# Altium footprint library 6-Connectors-4.PcbLib: 166 footprints (part 7 of 12)
Each footprint in its own frame and in the unit in brackets; x right, y up, seen from the top. Pads: shape width x height; smd on the part's side, far side on the other; paste and mask are expansions set on the pad; w line width, h text height; cw(c..) or ccw(c..) is an arc to the next point about the centre after c.
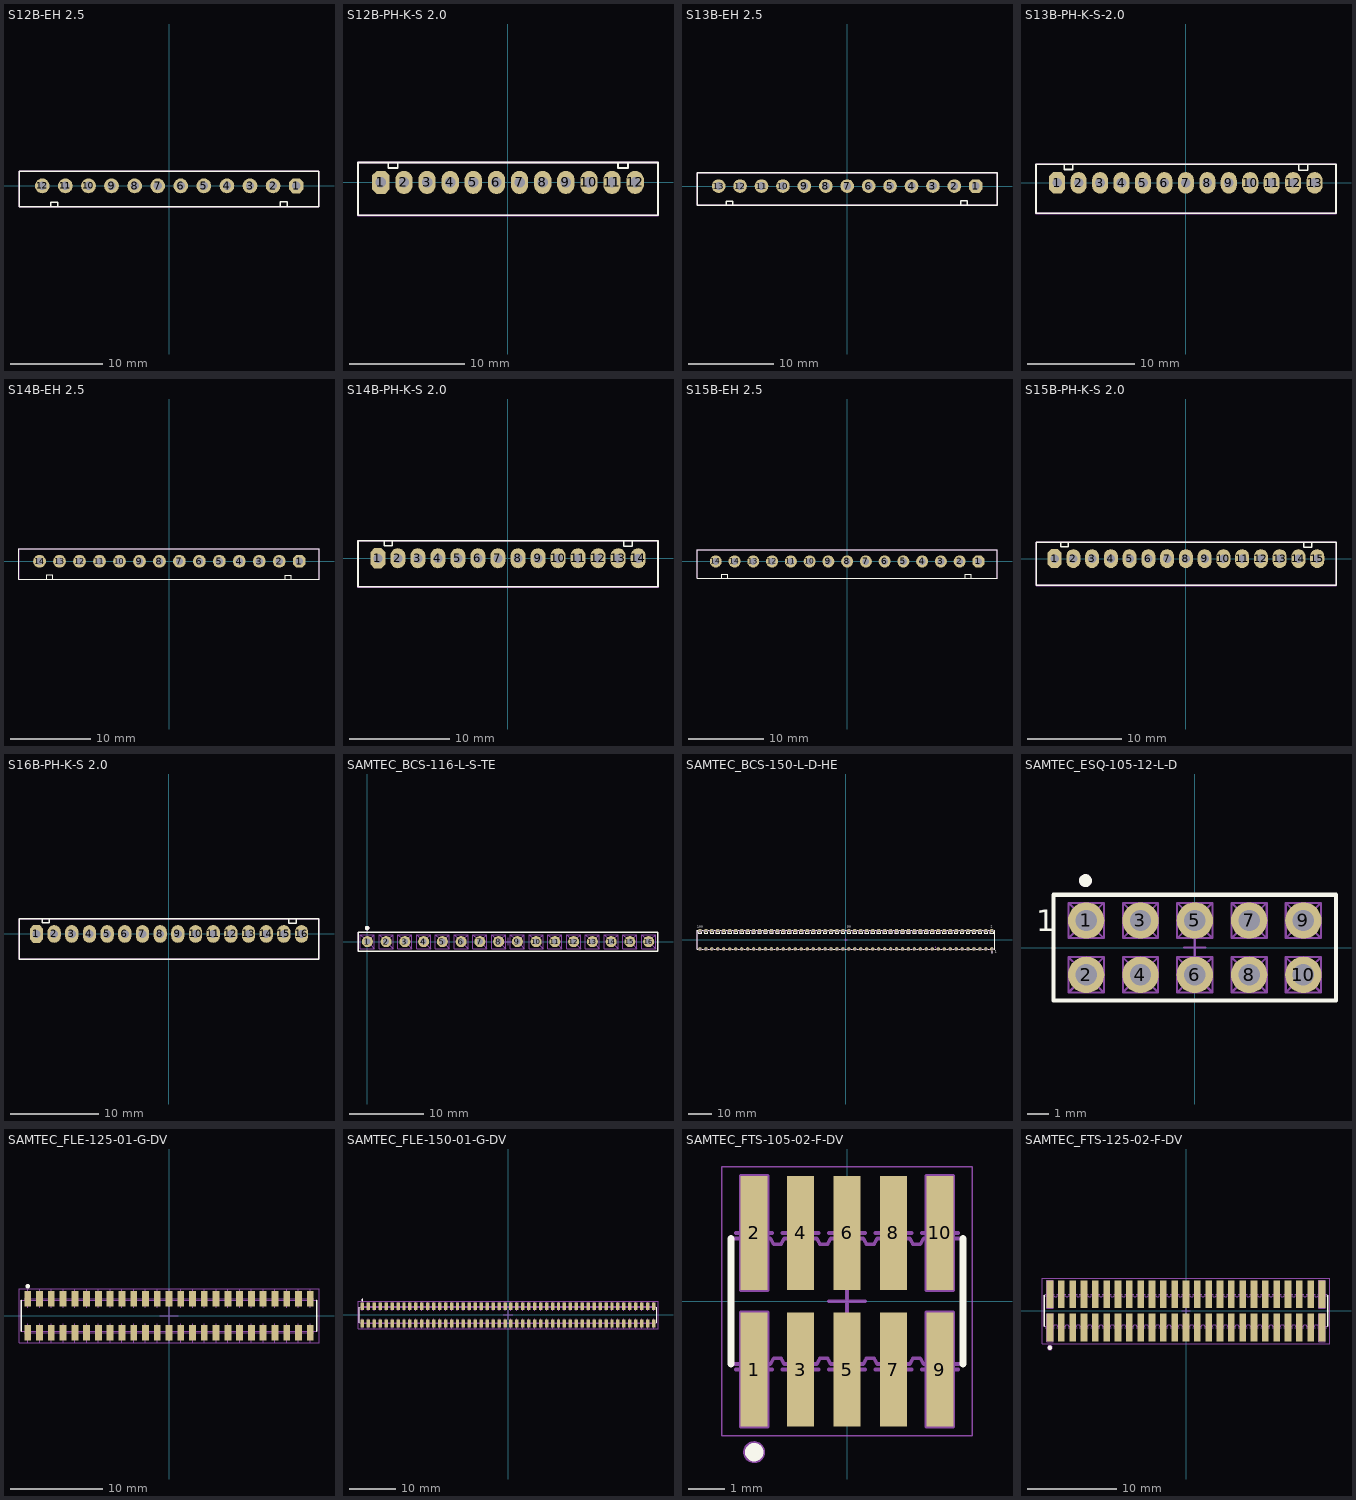
[diagram p6: the footprints below, top view; thin cyan lines are the x and y axes]

## S12B-EH 2.5 [mm]
height 3.25
pads (12):
  oct 1.6x1.6 hole 0.9: 1(13.75,0)
  round 1.6 hole 0.9 mask+0.07: 2(11.25,0) 3(8.75,0) 4(6.25,0) 5(3.75,0) 6(1.25,0) 7(-1.25,0) 8(-3.75,0) 9(-6.25,0) 10(-8.75,0) 11(-11.25,0) 12(-13.75,0)
Top Overlay:
  lines w0.15: -12.825,-2.25 -12.825,-1.75 -12.075,-1.75 -12.075,-2.225 ; 12,-2.225 12,-1.725 12.775,-1.725 12.775,-2.25 ; -16.275,-2.25 16.225,-2.25 16.225,1.575 -16.275,1.575 -16.275,-2.25
Mechanical 14:
  lines w0.15: -16.275,-2.25 16.225,-2.25 16.225,1.575 -16.275,1.575 -16.275,-2.25
Mechanical 15:
  lines w0.15: -16.275,-2.25 16.225,-2.25 16.225,1.575 -16.275,1.575 -16.275,-2.25
3D body "s12b-eh.stp": height 6, standoff -3.2, extent -16.25,-2.275 16.25,1.525

## S12B-PH-K-S 2.0 [mm]
height 3.25
pads (12):
  oct 1.5x2 hole 0.9: 1(-11,0)
  oval 1.5x2 hole 0.9: 2(-9,0) 3(-7,0) 4(-5,0) 5(-3,0) 6(-1,0) 7(1,0) 8(3,0) 9(5,0) 10(7,0) 11(9,0) 12(11,0)
Top Overlay:
  lines w0.152: -10.355,1.73 -10.355,1.24 -9.535,1.24 -9.535,1.72 ; 9.52,1.725 9.52,1.235 10.37,1.235 10.37,1.715 ; -12.975,-2.85 -12.975,1.725 12.975,1.725 12.975,-2.85 -12.975,-2.85
Mechanical 11:
  lines w0.152: -12.975,-2.85 -12.975,1.725 12.975,1.725 12.975,-2.85 -12.975,-2.85
Mechanical 14:
  lines w0.152: -12.975,-2.875 -12.975,1.725 12.975,1.725 12.975,-2.875 -12.975,-2.875
3D body "s12b-ph-k-s.stp": height 6, standoff -3.3, extent -13.025,-2.85 12.875,1.65

## S13B-EH 2.5 [mm]
height 3.25
pads (13):
  oct 1.6x1.6 hole 0.9: 1(15,0)
  round 1.6 hole 0.9 mask+0.07: 2(12.5,0) 3(10,0) 4(7.5,0) 5(5,0) 6(2.5,0) 7(0,0) 8(-2.5,0) 9(-5,0) 10(-7.5,0) 11(-10,0) 12(-12.5,0) 13(-15,0)
Top Overlay:
  lines w0.15: -14.1,-2.25 -14.1,-1.75 -13.35,-1.75 -13.35,-2.225 ; 13.25,-2.225 13.25,-1.725 14.025,-1.725 14.025,-2.25 ; -17.525,-2.25 17.475,-2.25 17.475,1.575 -17.525,1.575 -17.525,-2.25
Mechanical 14:
  lines w0.15: -17.525,-2.25 17.475,-2.25 17.475,1.575 -17.525,1.575 -17.525,-2.25
Mechanical 15:
  lines w0.15: -17.525,-2.25 17.475,-2.25 17.475,1.575 -17.525,1.575 -17.525,-2.25
3D body "s13b-eh1.stp": height 6, standoff -3.2, extent -17.5,-2.25 17.5,1.55

## S13B-PH-K-S-2.0 [mm]
height 3.25
pads (13):
  oct 1.5x2 hole 0.9: 1(-12,0)
  oval 1.5x2 hole 0.9: 2(-10,0) 3(-8,0) 4(-6,0) 5(-4,0) 6(-2,0) 7(0,0) 8(2,0) 9(4,0) 10(6,0) 11(8,0) 12(10,0) 13(12,0)
Top Overlay:
  lines w0.152: -11.355,1.73 -11.355,1.24 -10.535,1.24 -10.535,1.72 ; 10.52,1.675 10.52,1.185 11.37,1.185 11.37,1.665 ; -13.975,-2.85 -13.975,1.725 14,1.725 14,-2.85 -13.975,-2.85
Mechanical 11:
  lines w0.152: -13.975,-2.85 -13.975,1.725 14,1.725 14,-2.85 -13.975,-2.85
Mechanical 14:
  lines w0.152: -13.975,-2.875 -13.975,1.725 14,1.725 14,-2.875 -13.975,-2.875
3D body "s13b-ph-k-s.stp": height 6, standoff -3.4, extent -13.95,-2.85 13.95,1.65

## S14B-EH 2.5 [mm]
height 3.25
pads (14):
  oct 1.6x1.6 hole 0.9: 1(16.25,0)
  round 1.6 hole 0.9 mask+0.07: 2(13.75,0) 3(11.25,0) 4(8.75,0) 5(6.25,0) 6(3.75,0) 7(1.25,0) 8(-1.25,0) 9(-3.75,0) 10(-6.25,0) 11(-8.75,0) 12(-11.25,0) 13(-13.75,0) 14(-16.25,0)
Top Overlay:
  lines w0.15: -15.35,-2.2 -15.35,-1.7 -14.6,-1.7 -14.6,-2.175 ; 14.5,-2.225 14.5,-1.725 15.275,-1.725 15.275,-2.25 ; -18.825,-2.25 18.725,-2.25 18.725,1.575 -18.825,1.575 -18.825,-2.25
Mechanical 14:
  lines w0.15: -18.8,-2.25 18.725,-2.25 18.725,1.575 -18.8,1.575 -18.8,-2.25
Mechanical 15:
  lines w0.15: -18.825,-2.25 18.725,-2.25 18.725,1.575 -18.825,1.575 -18.825,-2.25
3D body "s14b-eh.stp": height 6, standoff -3.2, extent -18.775,-2.225 18.725,1.575

## S14B-PH-K-S 2.0 [mm]
height 3.25
pads (14):
  oct 1.5x2 hole 0.9: 1(-13,0)
  oval 1.5x2 hole 0.9: 2(-11,0) 3(-9,0) 4(-7,0) 5(-5,0) 6(-3,0) 7(-1,0) 8(1,0) 9(3,0) 10(5,0) 11(7,0) 12(9,0) 13(11,0) 14(13,0)
Top Overlay:
  lines w0.152: -12.355,1.73 -12.355,1.24 -11.535,1.24 -11.535,1.72 ; 11.545,1.675 11.545,1.185 12.395,1.185 12.395,1.665 ; -14.975,-2.85 14.975,-2.85 14.975,1.725 -14.975,1.725 -14.975,-2.85
Mechanical 11:
  lines w0.152: -14.975,-2.85 14.975,-2.85 14.975,1.725 -14.975,1.725 -14.975,-2.85
Mechanical 14:
  lines w0.152: -14.975,-2.875 14.975,-2.875 14.975,1.725 -14.975,1.725 -14.975,-2.875
3D body "s14b-ph-k-s.stp": height 6, standoff -3.3, extent -14.95,-2.8 14.95,1.7

## S15B-EH 2.5 [mm]
height 3.25
pads (15):
  oct 1.6x1.6 hole 0.9: 1(17.5,0)
  round 1.6 hole 0.9 mask+0.07: 2(15,0) 3(12.5,0) 4(10,0) 5(7.5,0) 6(5,0) 7(2.5,0) 8(0,0) 9(-2.5,0) 10(-5,0) 11(-7.5,0) 12(-10,0) 13(-12.5,0) 14(-17.5,0) 14(-15,0)
Top Overlay:
  lines w0.15: -16.675,-2.2 -16.675,-1.7 -15.925,-1.7 -15.925,-2.175 ; 15.75,-2.225 15.75,-1.725 16.525,-1.725 16.525,-2.25 ; -20,-2.25 -20,1.575 19.975,1.575 19.975,-2.25 -20,-2.25
Mechanical 14:
  lines w0.15: -20,-2.25 -20,1.575 19.975,1.575 19.975,-2.25 -20,-2.25
Mechanical 15:
  lines w0.15: -20,-2.25 -20,1.575 19.975,1.575 19.975,-2.25 -20,-2.25
3D body "s15b-eh-250.stp": height 6, standoff -3.2, extent -20,-2.225 20,1.575

## S15B-PH-K-S 2.0 [mm]
height 3.25
pads (15):
  oct 1.5x2 hole 0.9: 1(-14,0)
  oval 1.5x2 hole 0.9: 2(-12,0) 3(-10,0) 4(-8,0) 5(-6,0) 6(-4,0) 7(-2,0) 8(0,0) 9(2,0) 10(4,0) 11(6,0) 12(8,0) 13(10,0) 14(12,0) 15(14,0)
Top Overlay:
  lines w0.152: -13.355,1.73 -13.355,1.24 -12.535,1.24 -12.535,1.72 ; 12.57,1.7 12.57,1.21 13.42,1.21 13.42,1.69 ; -15.975,-2.85 16,-2.85 16,1.725 -15.975,1.725 -15.975,-2.85
Mechanical 11:
  lines w0.152: -15.975,-2.85 16,-2.85 16,1.725 -15.975,1.725 -15.975,-2.85
Mechanical 14:
  lines w0.152: -15.975,-2.875 16,-2.875 16,1.725 -15.975,1.725 -15.975,-2.875
3D body "s15b-ph-k-s.stp": height 6, standoff -3.4, extent -15.95,-2.825 15.95,1.675

## S16B-PH-K-S 2.0 [mm]
height 3.25
pads (16):
  oct 1.5x2 hole 0.9: 1(-15,0)
  oval 1.5x2 hole 0.9: 2(-13,0) 3(-11,0) 4(-9,0) 5(-7,0) 6(-5,0) 7(-3,0) 8(-1,0) 9(1,0) 10(3,0) 11(5,0) 12(7,0) 13(9,0) 14(11,0) 15(13,0) 16(15,0)
Top Overlay:
  lines w0.152: -14.355,1.73 -14.355,1.24 -13.535,1.24 -13.535,1.72 ; 13.545,1.7 13.545,1.21 14.395,1.21 14.395,1.69 ; -16.975,-2.85 -16.975,1.725 16.975,1.725 16.975,-2.85 -16.975,-2.85
Mechanical 11:
  lines w0.152: -16.975,-2.85 -16.975,1.725 16.975,1.725 16.975,-2.85 -16.975,-2.85
Mechanical 14:
  lines w0.152: -16.975,-2.875 -16.975,1.725 16.975,1.725 16.975,-2.875 -16.975,-2.875
3D body "s16b-ph-k-s.stp": height 6, standoff -3.3, extent -16.95,-2.8 16.95,1.7

## SAMTEC_BCS-116-L-S-TE [mm] "16 Contacts - Pitch 2.54mm - Single Row Vertical Entry Socket"
height 7.37
pads (16):
  round 1.5 hole 0.8: 1(0,0) 2(2.54,0) 3(5.08,0) 4(7.62,0) 5(10.16,0) 6(12.7,0) 7(15.24,0) 8(17.78,0) 9(20.32,0) 10(22.86,0) 11(25.4,0) 12(27.94,0) 13(30.48,0) 14(33.02,0) 15(35.56,0) 16(38.1,0)
Top Overlay:
  circle w0.3: c-0.037,1.838 r0.15
  lines w0.2: -1.27,-1.27 39.37,-1.27 39.37,1.27 -1.27,1.27 -1.27,-1.27
Mechanical 8:
  lines w0.1: -0.5,0 0,0 ; 0,-0.5 0,0 ; 0,0.5 0,0 ; 0.5,0 0,0 ; 2.04,0 2.54,0 ; 2.54,-0.5 2.54,0 ; 2.54,0.5 2.54,0 ; 3.04,0 2.54,0 ; 4.58,0 5.08,0 ; 5.08,-0.5 5.08,0 ; 5.08,0.5 5.08,0 ; 5.58,0 5.08,0 ; 7.12,0 7.62,0 ; 7.62,-0.5 7.62,0 ; 7.62,0.5 7.62,0 ; 8.12,0 7.62,0 ; 9.66,0 10.16,0 ; 10.16,-0.5 10.16,0 ; 10.16,0.5 10.16,0 ; 10.66,0 10.16,0 ; 12.2,0 12.7,0 ; 12.7,-0.5 12.7,0 ; 12.7,0.5 12.7,0 ; 13.2,0 12.7,0 ; 14.74,0 15.24,0 ; 15.24,-0.5 15.24,0 ; 15.24,0.5 15.24,0 ; 15.74,0 15.24,0 ; 17.28,0 17.78,0 ; 17.78,-0.5 17.78,0 ; 17.78,0.5 17.78,0 ; 18.28,0 17.78,0 ; 18.55,0 19.05,0 ; 19.05,-0.5 19.05,0 ; 19.05,0.5 19.05,0 ; 19.55,0 19.05,0 ; 19.82,0 20.32,0 ; 20.32,-0.5 20.32,0 ; 20.32,0.5 20.32,0 ; 20.82,0 20.32,0 ; 22.36,0 22.86,0 ; 22.86,-0.5 22.86,0 ; 22.86,0.5 22.86,0 ; 23.36,0 22.86,0 ; 24.9,0 25.4,0 ; 25.4,-0.5 25.4,0 ; 25.4,0.5 25.4,0 ; 25.9,0 25.4,0 ; 27.44,0 27.94,0 ; 27.94,-0.5 27.94,0 ; 27.94,0.5 27.94,0 ; 28.44,0 27.94,0 ; 29.98,0 30.48,0 ; 30.48,-0.5 30.48,0 ; 30.48,0.5 30.48,0 ; 30.98,0 30.48,0 ; 32.52,0 33.02,0 ; 33.02,-0.5 33.02,0 ; 33.02,0.5 33.02,0 ; 33.52,0 33.02,0 ; 35.06,0 35.56,0 ; 35.56,-0.5 35.56,0 ; 35.56,0.5 35.56,0 ; 36.06,0 35.56,0 ; 37.6,0 38.1,0 ; 38.1,-0.5 38.1,0 ; 38.1,0.5 38.1,0 ; 38.6,0 38.1,0
Mechanical 14:
  drawing of 181 lines, arcs and shapes, not listed
3D body "SAMTEC_BCS-116-L-S-TE.stp": height 7.37, standoff -3.1, extent -1.27,-1.27 39.37,1.27

## SAMTEC_BCS-150-L-D-HE [mm] "100 Contacts - Pitch 2.54mm - Dual Row Horizontal Entry Socket"
height 5.72
pads (100):
  round 1.5 hole 0.8: 1(62.23,-3.935) 2(62.23,3.935) 3(59.69,-3.935) 4(59.69,3.935) 5(57.15,-3.935) 6(57.15,3.935) 7(54.61,-3.935) 8(54.61,3.935) 9(52.07,-3.935) 10(52.07,3.935) 11(49.53,-3.935) 12(49.53,3.935) 13(46.99,-3.935) 14(46.99,3.935) 15(44.45,-3.935) 16(44.45,3.935) 17(41.91,-3.935) 18(41.91,3.935) 19(39.37,-3.935) 20(39.37,3.935) 21(36.83,-3.935) 22(36.83,3.935) 23(34.29,-3.935) 24(34.29,3.935) 25(31.75,-3.935) 26(31.75,3.935) 27(29.21,-3.935) 28(29.21,3.935) 29(26.67,-3.935) 30(26.67,3.935) 31(24.13,-3.935) 32(24.13,3.935) 33(21.59,-3.935) 34(21.59,3.935) 35(19.05,-3.935) 36(19.05,3.935) 37(16.51,-3.935) 38(16.51,3.935) 39(13.97,-3.935) 40(13.97,3.935) 41(11.43,-3.935) 42(11.43,3.935) 43(8.89,-3.935) 44(8.89,3.935) 45(6.35,-3.935) 46(6.35,3.935) 47(3.81,-3.935) 48(3.81,3.935) 49(1.27,-3.935) 50(1.27,3.935) 51(-1.27,-3.935) 52(-1.27,3.935) 53(-3.81,-3.935) 54(-3.81,3.935) 55(-6.35,-3.935) 56(-6.35,3.935) 57(-8.89,-3.935) 58(-8.89,3.935) 59(-11.43,-3.935) 60(-11.43,3.935) 61(-13.97,-3.935) 62(-13.97,3.935) 63(-16.51,-3.935) 64(-16.51,3.935) 65(-19.05,-3.935) 66(-19.05,3.935) 67(-21.59,-3.935) 68(-21.59,3.935) 69(-24.13,-3.935) 70(-24.13,3.935) 71(-26.67,-3.935) 72(-26.67,3.935) 73(-29.21,-3.935) 74(-29.21,3.935) 75(-31.75,-3.935) 76(-31.75,3.935) 77(-34.29,-3.935) 78(-34.29,3.935) 79(-36.83,-3.935) 80(-36.83,3.935) 81(-39.37,-3.935) 82(-39.37,3.935) 83(-41.91,-3.935) 84(-41.91,3.935) 85(-44.45,-3.935) 86(-44.45,3.935) 87(-46.99,-3.935) 88(-46.99,3.935) 89(-49.53,-3.935) 90(-49.53,3.935) 91(-52.07,-3.935) 92(-52.07,3.935) 93(-54.61,-3.935) 94(-54.61,3.935) 95(-57.15,-3.935) 96(-57.15,3.935) 97(-59.69,-3.935) 98(-59.69,3.935) 99(-62.23,-3.935) 100(-62.23,3.935)
Top Overlay:
  drawing of 257 lines, arcs and shapes, not listed
  text "50" at 0.5,5.175 h1
  text "100" at -63.375,5.136 h1
  text "1" at 63.405,-5.546 h1.02
  text "2" at 61.86,5.175 h1
Mechanical 8:
  drawing of 405 lines, arcs and shapes, not listed
Mechanical 14:
  drawing of 308 lines, arcs and shapes, not listed
  text "50" at 0.5,5.175 h1
  text "100" at -63.375,5.136 h1
  text "1" at 63.405,-5.546 h1.02
  text "2" at 61.86,5.175 h1
3D body "SAMTEC_BCS-150-L-D-HE.stp": height 5.72, standoff -3.1, extent -63.5,-4.064 63.5,4.064

## SAMTEC_ESQ-105-12-L-D [mm] "10 Contacts, Pitch 2.54mm - Top Entry, Dual Row, Through Mount Straigh Socket"
height 11.05
pads (10):
  round 1.7 hole 1: 1(-5.08,1.27) 2(-5.08,-1.27) 3(-2.54,1.27) 4(-2.54,-1.27) 5(0,1.27) 6(0,-1.27) 7(2.54,1.27) 8(2.54,-1.27) 9(5.08,1.27) 10(5.08,-1.27)
Top Overlay:
  circle w0.3: c-5.115,3.135 r0.15
  lines w0.2: -6.604,-2.477 -6.604,2.477 6.604,2.477 6.604,-2.477 -6.604,-2.477
  text "1" at -7.427,0.772 h1
Mechanical 8:
  lines w0.1: -5.58,-1.27 -5.08,-1.27 ; -5.58,1.27 -5.08,1.27 ; -5.08,-1.77 -5.08,-1.27 ; -5.08,-0.77 -5.08,-1.27 ; -5.08,0.77 -5.08,1.27 ; -5.08,1.77 -5.08,1.27 ; -4.58,-1.27 -5.08,-1.27 ; -4.58,1.27 -5.08,1.27 ; -3.04,-1.27 -2.54,-1.27 ; -3.04,1.27 -2.54,1.27 ; -2.54,-1.77 -2.54,-1.27 ; -2.54,-0.77 -2.54,-1.27 ; -2.54,0.77 -2.54,1.27 ; -2.54,1.77 -2.54,1.27 ; -2.04,-1.27 -2.54,-1.27 ; -2.04,1.27 -2.54,1.27 ; -0.5,-1.27 0,-1.27 ; -0.5,0 0,0 ; -0.5,1.27 0,1.27 ; 0,-1.77 0,-1.27 ; 0,-0.77 0,-1.27 ; 0,-0.5 0,0 ; 0,0.5 0,0 ; 0,0.77 0,1.27 ; 0,1.77 0,1.27 ; 0.5,-1.27 0,-1.27 ; 0.5,0 0,0 ; 0.5,1.27 0,1.27 ; 2.04,-1.27 2.54,-1.27 ; 2.04,1.27 2.54,1.27 ; 2.54,-1.77 2.54,-1.27 ; 2.54,-0.77 2.54,-1.27 ; 2.54,0.77 2.54,1.27 ; 2.54,1.77 2.54,1.27 ; 3.04,-1.27 2.54,-1.27 ; 3.04,1.27 2.54,1.27 ; 4.58,-1.27 5.08,-1.27 ; 4.58,1.27 5.08,1.27 ; 5.08,-1.77 5.08,-1.27 ; 5.08,-0.77 5.08,-1.27 ; 5.08,0.77 5.08,1.27 ; 5.08,1.77 5.08,1.27 ; 5.58,-1.27 5.08,-1.27 ; 5.58,1.27 5.08,1.27
Mechanical 14:
  circle w0.3: c-5.115,3.135 r0.15
  lines w0.1: -5.906,-2.095 -5.474,-1.664 ; -5.906,-2.095 -5.906,-0.445 ; -5.906,-2.095 -4.255,-2.095 ; -5.906,-0.445 -5.474,-0.876 ; -5.906,-0.445 -4.255,-0.445 ; -5.906,0.445 -5.474,0.876 ; -5.906,0.445 -5.906,2.095 ; -5.906,0.445 -4.255,0.445 ; -5.906,2.095 -5.474,1.664 ; -5.906,2.095 -4.255,2.095 ; -5.474,-1.664 -5.474,-0.876 ; -5.474,-1.664 -4.686,-1.664 ; -5.474,-0.876 -4.686,-0.876 ; -5.474,0.876 -5.474,1.664 ; -5.474,0.876 -4.686,0.876 ; -5.474,1.664 -4.686,1.664 ; -4.686,-1.664 -4.255,-2.095 ; -4.686,-1.664 -4.686,-0.876 ; -4.686,-0.876 -4.255,-0.445 ; -4.686,0.876 -4.255,0.445 ; -4.686,0.876 -4.686,1.664 ; -4.686,1.664 -4.255,2.095 ; -4.255,-2.095 -4.255,-0.445 ; -4.255,0.445 -4.255,2.095 ; -3.366,-2.095 -2.934,-1.664 ; -3.366,-2.095 -3.366,-0.445 ; -3.366,-2.095 -1.714,-2.095 ; -3.366,-0.445 -2.934,-0.876 ; -3.366,-0.445 -1.714,-0.445 ; -3.366,0.445 -2.934,0.876 ; -3.366,0.445 -3.366,2.095 ; -3.366,0.445 -1.714,0.445 ; -3.366,2.095 -2.934,1.664 ; -3.366,2.095 -1.714,2.095 ; -2.934,-1.664 -2.934,-0.876 ; -2.934,-1.664 -2.146,-1.664 ; -2.934,-0.876 -2.146,-0.876 ; -2.934,0.876 -2.934,1.664 ; -2.934,0.876 -2.146,0.876 ; -2.934,1.664 -2.146,1.664 ; -2.146,-1.664 -1.714,-2.095 ; -2.146,-1.664 -2.146,-0.876 ; -2.146,-0.876 -1.714,-0.445 ; -2.146,0.876 -1.714,0.445 ; -2.146,0.876 -2.146,1.664 ; -2.146,1.664 -1.714,2.095 ; -1.714,-2.095 -1.714,-0.445 ; -1.714,0.445 -1.714,2.095 ; -0.826,-2.095 -0.394,-1.664 ; -0.826,-2.095 -0.826,-0.445 ; -0.826,-2.095 0.826,-2.095 ; -0.826,-0.445 -0.394,-0.876 ; -0.826,-0.445 0.826,-0.445 ; -0.826,0.445 -0.394,0.876 ; -0.826,0.445 -0.826,2.095 ; -0.826,0.445 0.826,0.445 ; -0.826,2.095 -0.394,1.664 ; -0.826,2.095 0.826,2.095 ; -0.394,-1.664 -0.394,-0.876 ; -0.394,-1.664 0.394,-1.664 ; -0.394,-0.876 0.394,-0.876 ; -0.394,0.876 -0.394,1.664 ; -0.394,0.876 0.394,0.876 ; -0.394,1.664 0.394,1.664 ; 0.394,-1.664 0.826,-2.095 ; 0.394,-1.664 0.394,-0.876 ; 0.394,-0.876 0.826,-0.445 ; 0.394,0.876 0.826,0.445 ; 0.394,0.876 0.394,1.664 ; 0.394,1.664 0.826,2.095 ; 0.826,-2.095 0.826,-0.445 ; 0.826,0.445 0.826,2.095 ; 1.714,-2.095 2.146,-1.664 ; 1.714,-2.095 1.714,-0.445 ; 1.714,-2.095 3.366,-2.095 ; 1.714,-0.445 2.146,-0.876 ; 1.714,-0.445 3.366,-0.445 ; 1.714,0.445 2.146,0.876 ; 1.714,0.445 1.714,2.095 ; 1.714,0.445 3.366,0.445 ; 1.714,2.095 2.146,1.664 ; 1.714,2.095 3.366,2.095 ; 2.146,-1.664 2.146,-0.876 ; 2.146,-1.664 2.934,-1.664 ; 2.146,-0.876 2.934,-0.876 ; 2.146,0.876 2.146,1.664 ; 2.146,0.876 2.934,0.876 ; 2.146,1.664 2.934,1.664 ; 2.934,-1.664 3.366,-2.095 ; 2.934,-1.664 2.934,-0.876 ; 2.934,-0.876 3.366,-0.445 ; 2.934,0.876 3.366,0.445 ; 2.934,0.876 2.934,1.664 ; 2.934,1.664 3.366,2.095 ; 3.366,-2.095 3.366,-0.445 ; 3.366,0.445 3.366,2.095 ; 4.255,-2.095 4.686,-1.664 ; 4.255,-2.095 4.255,-0.445 ; 4.255,-2.095 5.906,-2.095 ; 4.255,-0.445 4.686,-0.876 ; 4.255,-0.445 5.906,-0.445 ; 4.255,0.445 4.686,0.876 ; 4.255,0.445 4.255,2.095 ; 4.255,0.445 5.906,0.445 ; 4.255,2.095 4.686,1.664 ; 4.255,2.095 5.906,2.095 ; 4.686,-1.664 4.686,-0.876 ; 4.686,-1.664 5.474,-1.664 ; 4.686,-0.876 5.474,-0.876 ; 4.686,0.876 4.686,1.664 ; 4.686,0.876 5.474,0.876 ; 4.686,1.664 5.474,1.664 ; 5.474,-1.664 5.906,-2.095 ; 5.474,-1.664 5.474,-0.876 ; 5.474,-0.876 5.906,-0.445 ; 5.474,0.876 5.906,0.445 ; 5.474,0.876 5.474,1.664 ; 5.474,1.664 5.906,2.095 ; 5.906,-2.095 5.906,-0.445 ; 5.906,0.445 5.906,2.095 ; -6.604,-2.477 -6.604,2.477 6.604,2.477 6.604,-2.477 -6.604,-2.477
  text "1" at -7.427,0.772 h1
3D body "SAMTEC_ESQ-105-12-L-D.stp": height 11.05, standoff -2.29, extent -6.604,-2.54 6.604,2.54

## SAMTEC_FLE-125-01-G-DV [mm] "50 Contacts - Pitch 1.27mm - Top Entry, Dual Row Surface Mount Receptacle"
height 4.55
pads (50):
  rect 0.74x1.675 smd: 1(-15.24,1.843) 2(-15.24,-1.843) 3(-13.97,1.843) 4(-13.97,-1.843) 5(-12.7,1.843) 6(-12.7,-1.843) 7(-11.43,1.843) 8(-11.43,-1.843) 9(-10.16,1.843) 10(-10.16,-1.843) 11(-8.89,1.843) 12(-8.89,-1.843) 13(-7.62,1.843) 14(-7.62,-1.843) 15(-6.35,1.843) 16(-6.35,-1.843) 17(-5.08,1.843) 18(-5.08,-1.843) 19(-3.81,1.843) 20(-3.81,-1.843) 21(-2.54,1.843) 22(-2.54,-1.843) 23(-1.27,1.843) 24(-1.27,-1.843) 25(0,1.843) 26(0,-1.843) 27(1.27,1.843) 28(1.27,-1.843) 29(2.54,1.843) 30(2.54,-1.843) 31(3.81,1.843) 32(3.81,-1.843) 33(5.08,1.843) 34(5.08,-1.843) 35(6.35,1.843) 36(6.35,-1.843) 37(7.62,1.843) 38(7.62,-1.843) 39(8.89,1.843) 40(8.89,-1.843) 41(10.16,1.843) 42(10.16,-1.843) 43(11.43,1.843) 44(11.43,-1.843) 45(12.7,1.843) 46(12.7,-1.843) 47(13.97,1.843) 48(13.97,-1.843) 49(15.24,1.843) 50(15.24,-1.843)
Top Overlay:
  circle w0.25: c-15.242,3.175 r0.125
  lines w0.2: -15.932,-1.664 -15.932,1.664 ; 15.932,-1.664 15.932,1.664
Mechanical 8:
  lines w0.1: -15.61,-1.843 15.61,-1.843 ; -15.61,1.843 15.61,1.843 ; -15.24,-2.843 -15.24,-1.843 -15.24,-0.843 ; -15.24,0.843 -15.24,1.843 -15.24,2.843 ; -13.97,-2.843 -13.97,-1.843 -13.97,-0.843 ; -13.97,0.843 -13.97,1.843 -13.97,2.843 ; -12.7,-2.843 -12.7,-1.843 -12.7,-0.843 ; -12.7,0.843 -12.7,1.843 -12.7,2.843 ; -11.43,-2.843 -11.43,-1.843 -11.43,-0.843 ; -11.43,0.843 -11.43,1.843 -11.43,2.843 ; -10.16,-2.843 -10.16,-1.843 -10.16,-0.843 ; -10.16,0.843 -10.16,1.843 -10.16,2.843 ; -8.89,-2.843 -8.89,-1.843 -8.89,-0.843 ; -8.89,0.843 -8.89,1.843 -8.89,2.843 ; -7.62,-2.843 -7.62,-1.843 -7.62,-0.843 ; -7.62,0.843 -7.62,1.843 -7.62,2.843 ; -6.35,-2.843 -6.35,-1.843 -6.35,-0.843 ; -6.35,0.843 -6.35,1.843 -6.35,2.843 ; -5.08,-2.843 -5.08,-1.843 -5.08,-0.843 ; -5.08,0.843 -5.08,1.843 -5.08,2.843 ; -3.81,-2.843 -3.81,-1.843 -3.81,-0.843 ; -3.81,0.843 -3.81,1.843 -3.81,2.843 ; -2.54,-2.843 -2.54,-1.843 -2.54,-0.843 ; -2.54,0.843 -2.54,1.843 -2.54,2.843 ; -1.27,-2.843 -1.27,-1.843 -1.27,-0.843 ; -1.27,0.843 -1.27,1.843 -1.27,2.843 ; -1,0 0,0 ; 0,-2.843 0,-1.843 0,-0.843 ; 0,-1 0,0 ; 0,0.843 0,1.843 0,2.843 ; 0,1 0,0 ; 1,0 0,0 ; 1.27,-2.843 1.27,-1.843 1.27,-0.843 ; 1.27,0.843 1.27,1.843 1.27,2.843 ; 2.54,-2.843 2.54,-1.843 2.54,-0.843 ; 2.54,0.843 2.54,1.843 2.54,2.843 ; 3.81,-2.843 3.81,-1.843 3.81,-0.843 ; 3.81,0.843 3.81,1.843 3.81,2.843 ; 5.08,-2.843 5.08,-1.843 5.08,-0.843 ; 5.08,0.843 5.08,1.843 5.08,2.843 ; 6.35,-2.843 6.35,-1.843 6.35,-0.843 ; 6.35,0.843 6.35,1.843 6.35,2.843 ; 7.62,-2.843 7.62,-1.843 7.62,-0.843 ; 7.62,0.843 7.62,1.843 7.62,2.843 ; 8.89,-2.843 8.89,-1.843 8.89,-0.843 ; 8.89,0.843 8.89,1.843 8.89,2.843 ; 10.16,-2.843 10.16,-1.843 10.16,-0.843 ; 10.16,0.843 10.16,1.843 10.16,2.843 ; 11.43,-2.843 11.43,-1.843 11.43,-0.843 ; 11.43,0.843 11.43,1.843 11.43,2.843 ; 12.7,-2.843 12.7,-1.843 12.7,-0.843 ; 12.7,0.843 12.7,1.843 12.7,2.843 ; 13.97,-2.843 13.97,-1.843 13.97,-0.843 ; 13.97,0.843 13.97,1.843 13.97,2.843 ; 15.24,-2.843 15.24,-1.843 15.24,-0.843 ; 15.24,0.843 15.24,1.843 15.24,2.843
Mechanical 14:
  circle w0.1: c-15.242,3.175 r0.125
  lines w0.1: -15.932,-1.664 15.932,-1.664 15.932,1.664 -15.932,1.664 -15.932,-1.664
Mechanical 15:
  lines w0.1: -16.182,-2.93 -16.182,2.93 16.182,2.93 16.182,-2.93 -16.182,-2.93
3D body "p168-075.stp": height 0.02, standoff 0, extent -0.375,-2.682 0.375,-1.002
3D body "p168-075.stp": height 0.02, standoff 0, extent -0.375,1.003 0.375,2.683
3D body "p168-075.stp": height 0.02, standoff 0, extent 2.165,-2.682 2.915,-1.002
3D body "p168-075.stp": height 0.02, standoff 0, extent 2.165,1.003 2.915,2.683
3D body "p168-075.stp": height 0.02, standoff 0, extent 14.865,1.003 15.615,2.683
3D body "p168-075.stp": height 0.02, standoff 0, extent 14.865,-2.682 15.615,-1.002
3D body "p168-075.stp": height 0.02, standoff 0, extent 13.595,-2.682 14.345,-1.002
3D body "p168-075.stp": height 0.02, standoff 0, extent 13.595,1.003 14.345,2.683
3D body "p168-075.stp": height 0.02, standoff 0, extent 12.325,1.003 13.075,2.683
3D body "p168-075.stp": height 0.02, standoff 0, extent 12.325,-2.682 13.075,-1.002
3D body "p168-075.stp": height 0.02, standoff 0, extent 11.055,-2.682 11.805,-1.002
3D body "p168-075.stp": height 0.02, standoff 0, extent 11.055,1.003 11.805,2.683
3D body "p168-075.stp": height 0.02, standoff 0, extent 9.785,1.003 10.535,2.683
3D body "p168-075.stp": height 0.02, standoff 0, extent 9.785,-2.682 10.535,-1.002
3D body "p168-075.stp": height 0.02, standoff 0, extent 8.515,-2.682 9.265,-1.002
3D body "p168-075.stp": height 0.02, standoff 0, extent 8.515,1.003 9.265,2.683
3D body "p168-075.stp": height 0.02, standoff 0, extent 7.245,1.003 7.995,2.683
3D body "p168-075.stp": height 0.02, standoff 0, extent 7.245,-2.682 7.995,-1.002
3D body "p168-075.stp": height 0.02, standoff 0, extent 5.975,-2.682 6.725,-1.002
3D body "p168-075.stp": height 0.02, standoff 0, extent 5.975,1.003 6.725,2.683
3D body "p168-075.stp": height 0.02, standoff 0, extent 4.705,1.003 5.455,2.683
3D body "p168-075.stp": height 0.02, standoff 0, extent 4.705,-2.682 5.455,-1.002
3D body "p168-075.stp": height 0.02, standoff 0, extent 3.435,-2.682 4.185,-1.002
3D body "p168-075.stp": height 0.02, standoff 0, extent 3.435,1.003 4.185,2.683
3D body "p168-075.stp": height 0.02, standoff 0, extent 2.165,1.003 2.915,2.683
3D body "p168-075.stp": height 0.02, standoff 0, extent 2.165,-2.682 2.915,-1.002
3D body "p168-075.stp": height 0.02, standoff 0, extent 0.895,-2.682 1.645,-1.002
3D body "p168-075.stp": height 0.02, standoff 0, extent 0.895,1.003 1.645,2.683
3D body "p168-075.stp": height 0.02, standoff 0, extent -1.645,1.003 -0.895,2.683
3D body "p168-075.stp": height 0.02, standoff 0, extent -1.645,-2.682 -0.895,-1.002
3D body "p168-075.stp": height 0.02, standoff 0, extent -2.915,-2.682 -2.165,-1.002
3D body "p168-075.stp": height 0.02, standoff 0, extent -4.185,-2.682 -3.435,-1.002
3D body "p168-075.stp": height 0.02, standoff 0, extent -2.915,1.003 -2.165,2.683
3D body "p168-075.stp": height 0.02, standoff 0, extent -4.185,1.003 -3.435,2.683
3D body "p168-075.stp": height 0.02, standoff 0, extent -5.455,1.003 -4.705,2.683
3D body "p168-075.stp": height 0.02, standoff 0, extent -5.455,-2.682 -4.705,-1.002
3D body "p168-075.stp": height 0.02, standoff 0, extent -6.725,-2.682 -5.975,-1.002
3D body "p168-075.stp": height 0.02, standoff 0, extent -6.725,1.003 -5.975,2.683
3D body "p168-075.stp": height 0.02, standoff 0, extent -7.995,1.003 -7.245,2.683
3D body "p168-075.stp": height 0.02, standoff 0, extent -7.995,-2.682 -7.245,-1.002
3D body "p168-075.stp": height 0.02, standoff 0, extent -9.265,-2.682 -8.515,-1.002
3D body "p168-075.stp": height 0.02, standoff 0, extent -9.265,1.003 -8.515,2.683
3D body "p168-075.stp": height 0.02, standoff 0, extent -10.535,1.003 -9.785,2.683
3D body "p168-075.stp": height 0.02, standoff 0, extent -10.535,-2.682 -9.785,-1.002
3D body "p168-075.stp": height 0.02, standoff 0, extent -11.805,1.003 -11.055,2.683
3D body "p168-075.stp": height 0.02, standoff 0, extent -11.805,-2.682 -11.055,-1.002
3D body "p168-075.stp": height 0.02, standoff 0, extent -13.075,-2.682 -12.325,-1.002
3D body "p168-075.stp": height 0.02, standoff 0, extent -13.075,1.003 -12.325,2.683
3D body "p168-075.stp": height 0.02, standoff 0, extent -14.345,1.003 -13.595,2.683
3D body "p168-075.stp": height 0.02, standoff 0, extent -14.345,-2.682 -13.595,-1.002
3D body "p168-075.stp": height 0.02, standoff 0, extent -15.615,-2.682 -14.865,-1.002
3D body "p168-075.stp": height 0.02, standoff 0, extent -15.615,1.003 -14.865,2.683
3D body "SAMTEC_FLE-125-01-G-DV.stp": height 4.55, standoff 0, extent -15.932,-2.299 15.932,2.299

## SAMTEC_FLE-150-01-G-DV [mm] "100 Contacts - Pitch 1.27mm - Top Entry, Dual Row Surface Mount Receptacle"
height 4.55
pads (100):
  rect 0.74x1.675 smd: 1(-31.115,1.843) 2(-31.115,-1.843) 3(-29.845,1.843) 4(-29.845,-1.843) 5(-28.575,1.843) 6(-28.575,-1.843) 7(-27.305,1.843) 8(-27.305,-1.843) 9(-26.035,1.843) 10(-26.035,-1.843) 11(-24.765,1.843) 12(-24.765,-1.843) 13(-23.495,1.843) 14(-23.495,-1.843) 15(-22.225,1.843) 16(-22.225,-1.843) 17(-20.955,1.843) 18(-20.955,-1.843) 19(-19.685,1.843) 20(-19.685,-1.843) 21(-18.415,1.843) 22(-18.415,-1.843) 23(-17.145,1.843) 24(-17.145,-1.843) 25(-15.875,1.843) 26(-15.875,-1.843) 27(-14.605,1.843) 28(-14.605,-1.843) 29(-13.335,1.843) 30(-13.335,-1.843) 31(-12.065,1.843) 32(-12.065,-1.843) 33(-10.795,1.843) 34(-10.795,-1.843) 35(-9.525,1.843) 36(-9.525,-1.843) 37(-8.255,1.843) 38(-8.255,-1.843) 39(-6.985,1.843) 40(-6.985,-1.843) 41(-5.715,1.843) 42(-5.715,-1.843) 43(-4.445,1.843) 44(-4.445,-1.843) 45(-3.175,1.843) 46(-3.175,-1.843) 47(-1.905,1.843) 48(-1.905,-1.843) 49(-0.635,1.843) 50(-0.635,-1.843) 51(0.635,1.843) 52(0.635,-1.843) 53(1.905,1.843) 54(1.905,-1.843) 55(3.175,1.843) 56(3.175,-1.843) 57(4.445,1.843) 58(4.445,-1.843) 59(5.715,1.843) 60(5.715,-1.843) 61(6.985,1.843) 62(6.985,-1.843) 63(8.255,1.843) 64(8.255,-1.843) 65(9.525,1.843) 66(9.525,-1.843) 67(10.795,1.843) 68(10.795,-1.843) 69(12.065,1.843) 70(12.065,-1.843) 71(13.335,1.843) 72(13.335,-1.843) 73(14.605,1.843) 74(14.605,-1.843) 75(15.875,1.843) 76(15.875,-1.843) 77(17.145,1.843) 78(17.145,-1.843) 79(18.415,1.843) 80(18.415,-1.843) 81(19.685,1.843) 82(19.685,-1.843) 83(20.955,1.843) 84(20.955,-1.843) 85(22.225,1.843) 86(22.225,-1.843) 87(23.495,1.843) 88(23.495,-1.843) 89(24.765,1.843) 90(24.765,-1.843) 91(26.035,1.843) 92(26.035,-1.843) 93(27.305,1.843) 94(27.305,-1.843) 95(28.575,1.843) 96(28.575,-1.843) 97(29.845,1.843) 98(29.845,-1.843) 99(31.115,1.843) 100(31.115,-1.843)
Top Overlay:
  circle w0.25: c-31.117,3.175 r0.125
  lines w0.2: -31.807,-1.664 -31.807,1.664 ; 31.807,-1.664 31.807,1.664
Mechanical 8:
  drawing of 206 lines, arcs and shapes, not listed
Mechanical 14:
  circle w0.1: c-31.117,3.175 r0.125
  lines w0.1: -31.807,-1.664 31.807,-1.664 31.807,1.664 -31.807,1.664 -31.807,-1.664
Mechanical 15:
  lines w0.1: -32.057,-2.93 -32.057,2.93 32.057,2.93 32.057,-2.93 -32.057,-2.93
3D body "p168-075.stp": height 0.02, standoff 0, extent 30.74,-2.682 31.49,-1.002
3D body "p168-075.stp": height 0.02, standoff 0, extent 30.74,1.003 31.49,2.683
3D body "p168-075.stp": height 0.02, standoff 0, extent 29.47,-2.682 30.22,-1.002
3D body "p168-075.stp": height 0.02, standoff 0, extent 29.47,1.003 30.22,2.683
3D body "p168-075.stp": height 0.02, standoff 0, extent 28.2,-2.682 28.95,-1.002
3D body "p168-075.stp": height 0.02, standoff 0, extent 28.2,1.003 28.95,2.683
3D body "p168-075.stp": height 0.02, standoff 0, extent 26.93,-2.682 27.68,-1.002
3D body "p168-075.stp": height 0.02, standoff 0, extent 26.93,1.003 27.68,2.683
3D body "p168-075.stp": height 0.02, standoff 0, extent 25.66,-2.682 26.41,-1.002
3D body "p168-075.stp": height 0.02, standoff 0, extent 25.66,1.003 26.41,2.683
3D body "p168-075.stp": height 0.02, standoff 0, extent 24.39,-2.682 25.14,-1.002
3D body "p168-075.stp": height 0.02, standoff 0, extent 24.39,1.003 25.14,2.683
3D body "p168-075.stp": height 0.02, standoff 0, extent 23.12,-2.682 23.87,-1.002
3D body "p168-075.stp": height 0.02, standoff 0, extent 23.12,1.003 23.87,2.683
3D body "p168-075.stp": height 0.02, standoff 0, extent 21.85,-2.682 22.6,-1.002
3D body "p168-075.stp": height 0.02, standoff 0, extent 21.85,1.003 22.6,2.683
3D body "p168-075.stp": height 0.02, standoff 0, extent 20.58,-2.682 21.33,-1.002
3D body "p168-075.stp": height 0.02, standoff 0, extent 20.58,1.003 21.33,2.683
3D body "p168-075.stp": height 0.02, standoff 0, extent 19.31,-2.682 20.06,-1.002
3D body "p168-075.stp": height 0.02, standoff 0, extent 19.31,1.003 20.06,2.683
3D body "p168-075.stp": height 0.02, standoff 0, extent 18.04,-2.682 18.79,-1.002
3D body "p168-075.stp": height 0.02, standoff 0, extent 18.04,1.003 18.79,2.683
3D body "p168-075.stp": height 0.02, standoff 0, extent 16.77,-2.682 17.52,-1.002
3D body "p168-075.stp": height 0.02, standoff 0, extent 16.77,1.003 17.52,2.683
3D body "p168-075.stp": height 0.02, standoff 0, extent 15.5,-2.682 16.25,-1.002
3D body "p168-075.stp": height 0.02, standoff 0, extent 15.5,1.003 16.25,2.683
3D body "p168-075.stp": height 0.02, standoff 0, extent 14.23,-2.682 14.98,-1.002
3D body "p168-075.stp": height 0.02, standoff 0, extent 14.23,1.003 14.98,2.683
3D body "p168-075.stp": height 0.02, standoff 0, extent 12.96,-2.682 13.71,-1.002
3D body "p168-075.stp": height 0.02, standoff 0, extent 12.96,1.003 13.71,2.683
3D body "p168-075.stp": height 0.02, standoff 0, extent 11.69,-2.682 12.44,-1.002
3D body "p168-075.stp": height 0.02, standoff 0, extent 11.69,1.003 12.44,2.683
3D body "p168-075.stp": height 0.02, standoff 0, extent 10.42,-2.682 11.17,-1.002
3D body "p168-075.stp": height 0.02, standoff 0, extent 10.42,1.003 11.17,2.683
3D body "p168-075.stp": height 0.02, standoff 0, extent 9.15,-2.682 9.9,-1.002
3D body "p168-075.stp": height 0.02, standoff 0, extent 9.15,1.003 9.9,2.683
3D body "p168-075.stp": height 0.02, standoff 0, extent 7.88,-2.682 8.63,-1.002
3D body "p168-075.stp": height 0.02, standoff 0, extent 7.88,1.003 8.63,2.683
3D body "p168-075.stp": height 0.02, standoff 0, extent 6.61,-2.682 7.36,-1.002
3D body "p168-075.stp": height 0.02, standoff 0, extent 6.61,1.003 7.36,2.683
3D body "p168-075.stp": height 0.02, standoff 0, extent 5.34,-2.682 6.09,-1.002
3D body "p168-075.stp": height 0.02, standoff 0, extent 5.34,1.003 6.09,2.683
3D body "p168-075.stp": height 0.02, standoff 0, extent 4.07,-2.682 4.82,-1.002
3D body "p168-075.stp": height 0.02, standoff 0, extent 4.07,1.003 4.82,2.683
3D body "p168-075.stp": height 0.02, standoff 0, extent 2.8,-2.682 3.55,-1.002
3D body "p168-075.stp": height 0.02, standoff 0, extent 2.8,1.003 3.55,2.683
3D body "p168-075.stp": height 0.02, standoff 0, extent 1.53,-2.682 2.28,-1.002
3D body "p168-075.stp": height 0.02, standoff 0, extent 1.53,1.003 2.28,2.683
3D body "p168-075.stp": height 0.02, standoff 0, extent 0.26,-2.682 1.01,-1.002
3D body "p168-075.stp": height 0.02, standoff 0, extent 0.26,1.003 1.01,2.683
3D body "p168-075.stp": height 0.02, standoff 0, extent -1.01,-2.682 -0.26,-1.002
3D body "p168-075.stp": height 0.02, standoff 0, extent -1.01,1.003 -0.26,2.683
3D body "p168-075.stp": height 0.02, standoff 0, extent -2.28,-2.682 -1.53,-1.002
3D body "p168-075.stp": height 0.02, standoff 0, extent -2.28,1.003 -1.53,2.683
3D body "p168-075.stp": height 0.02, standoff 0, extent -3.55,-2.682 -2.8,-1.002
3D body "p168-075.stp": height 0.02, standoff 0, extent -3.55,1.003 -2.8,2.683
3D body "p168-075.stp": height 0.02, standoff 0, extent -4.82,-2.682 -4.07,-1.002
3D body "p168-075.stp": height 0.02, standoff 0, extent -4.82,1.003 -4.07,2.683
3D body "p168-075.stp": height 0.02, standoff 0, extent -6.09,-2.682 -5.34,-1.002
3D body "p168-075.stp": height 0.02, standoff 0, extent -6.09,1.003 -5.34,2.683
3D body "p168-075.stp": height 0.02, standoff 0, extent -7.36,-2.682 -6.61,-1.002
3D body "p168-075.stp": height 0.02, standoff 0, extent -7.36,1.003 -6.61,2.683
3D body "p168-075.stp": height 0.02, standoff 0, extent -8.63,-2.682 -7.88,-1.002
3D body "p168-075.stp": height 0.02, standoff 0, extent -8.63,1.003 -7.88,2.683
3D body "p168-075.stp": height 0.02, standoff 0, extent -9.9,-2.682 -9.15,-1.002
3D body "p168-075.stp": height 0.02, standoff 0, extent -9.9,1.003 -9.15,2.683
3D body "p168-075.stp": height 0.02, standoff 0, extent -11.17,-2.682 -10.42,-1.002
3D body "p168-075.stp": height 0.02, standoff 0, extent -11.17,1.003 -10.42,2.683
3D body "p168-075.stp": height 0.02, standoff 0, extent -12.44,-2.682 -11.69,-1.002
3D body "p168-075.stp": height 0.02, standoff 0, extent -12.44,1.003 -11.69,2.683
3D body "p168-075.stp": height 0.02, standoff 0, extent -13.71,-2.682 -12.96,-1.002
3D body "p168-075.stp": height 0.02, standoff 0, extent -13.71,1.003 -12.96,2.683
3D body "p168-075.stp": height 0.02, standoff 0, extent -14.98,-2.682 -14.23,-1.002
3D body "p168-075.stp": height 0.02, standoff 0, extent -14.98,1.003 -14.23,2.683
3D body "p168-075.stp": height 0.02, standoff 0, extent -16.25,-2.682 -15.5,-1.002
3D body "p168-075.stp": height 0.02, standoff 0, extent -16.25,1.003 -15.5,2.683
3D body "p168-075.stp": height 0.02, standoff 0, extent -17.52,-2.682 -16.77,-1.002
3D body "p168-075.stp": height 0.02, standoff 0, extent -17.52,1.003 -16.77,2.683
3D body "p168-075.stp": height 0.02, standoff 0, extent -18.79,-2.682 -18.04,-1.002
3D body "p168-075.stp": height 0.02, standoff 0, extent -18.79,1.003 -18.04,2.683
3D body "p168-075.stp": height 0.02, standoff 0, extent -20.06,-2.682 -19.31,-1.002
3D body "p168-075.stp": height 0.02, standoff 0, extent -20.06,1.003 -19.31,2.683
3D body "p168-075.stp": height 0.02, standoff 0, extent -21.33,-2.682 -20.58,-1.002
3D body "p168-075.stp": height 0.02, standoff 0, extent -21.33,1.003 -20.58,2.683
3D body "p168-075.stp": height 0.02, standoff 0, extent -22.6,-2.682 -21.85,-1.002
3D body "p168-075.stp": height 0.02, standoff 0, extent -22.6,1.003 -21.85,2.683
3D body "p168-075.stp": height 0.02, standoff 0, extent -23.87,-2.682 -23.12,-1.002
3D body "p168-075.stp": height 0.02, standoff 0, extent -23.87,1.003 -23.12,2.683
3D body "p168-075.stp": height 0.02, standoff 0, extent -25.14,-2.682 -24.39,-1.002
3D body "p168-075.stp": height 0.02, standoff 0, extent -25.14,1.003 -24.39,2.683
3D body "p168-075.stp": height 0.02, standoff 0, extent -26.41,-2.682 -25.66,-1.002
3D body "p168-075.stp": height 0.02, standoff 0, extent -26.41,1.003 -25.66,2.683
3D body "p168-075.stp": height 0.02, standoff 0, extent -27.68,-2.682 -26.93,-1.002
3D body "p168-075.stp": height 0.02, standoff 0, extent -27.68,1.003 -26.93,2.683
3D body "p168-075.stp": height 0.02, standoff 0, extent -28.95,-2.682 -28.2,-1.002
3D body "p168-075.stp": height 0.02, standoff 0, extent -28.95,1.003 -28.2,2.683
3D body "p168-075.stp": height 0.02, standoff 0, extent -30.22,-2.682 -29.47,-1.002
3D body "p168-075.stp": height 0.02, standoff 0, extent -30.22,1.003 -29.47,2.683
3D body "p168-075.stp": height 0.02, standoff 0, extent -31.49,-2.682 -30.74,-1.002
3D body "p168-075.stp": height 0.02, standoff 0, extent -31.49,1.003 -30.74,2.683
3D body "SAMTEC_FLE-150-01-G-DV.stp": height 4.55, standoff 0, extent -31.807,-2.299 31.807,2.299

## SAMTEC_FTS-105-02-F-DV [mm] "10 Contacts - Pitch 1.27mm - Dual Row, Vertical, Surface Mount Terminal Strip"
height 3.18
pads (10):
  rect 0.74x3.125 smd: 1(-2.54,-1.868) 2(-2.54,1.868) 3(-1.27,-1.868) 4(-1.27,1.868) 5(0,-1.868) 6(0,1.868) 7(1.27,-1.868) 8(1.27,1.868) 9(2.54,-1.868) 10(2.54,1.868)
Top Overlay:
  circle w0.25: c-2.538,-4.128 r0.125
  circle w0.25: c-2.538,-4.128 r0.125
  lines w0.2: -3.175,-1.714 -3.175,1.714 ; 3.175,-1.714 3.175,1.714
Mechanical 8:
  lines w0.1: -3.04,-1.868 -2.54,-1.868 ; -3.04,1.868 -2.54,1.868 ; -2.54,-2.368 -2.54,-1.868 ; -2.54,-1.368 -2.54,-1.868 ; -2.54,1.368 -2.54,1.868 ; -2.54,2.368 -2.54,1.868 ; -2.04,-1.868 -2.54,-1.868 ; -2.04,1.868 -2.54,1.868 ; -1.77,-1.868 -1.27,-1.868 ; -1.77,1.868 -1.27,1.868 ; -1.27,-2.368 -1.27,-1.868 ; -1.27,-1.368 -1.27,-1.868 ; -1.27,1.368 -1.27,1.868 ; -1.27,2.368 -1.27,1.868 ; -0.77,-1.868 -1.27,-1.868 ; -0.77,1.868 -1.27,1.868 ; -0.5,-1.868 0,-1.868 ; -0.5,0 0,0 ; -0.5,1.868 0,1.868 ; 0,-2.368 0,-1.868 ; 0,-1.368 0,-1.868 ; 0,-0.5 0,0 ; 0,0.5 0,0 ; 0,1.368 0,1.868 ; 0,2.368 0,1.868 ; 0.5,-1.868 0,-1.868 ; 0.5,0 0,0 ; 0.5,1.868 0,1.868 ; 0.77,-1.868 1.27,-1.868 ; 0.77,1.868 1.27,1.868 ; 1.27,-2.368 1.27,-1.868 ; 1.27,-1.368 1.27,-1.868 ; 1.27,1.368 1.27,1.868 ; 1.27,2.368 1.27,1.868 ; 1.77,-1.868 1.27,-1.868 ; 1.77,1.868 1.27,1.868 ; 2.04,-1.868 2.54,-1.868 ; 2.04,1.868 2.54,1.868 ; 2.54,-2.368 2.54,-1.868 ; 2.54,-1.368 2.54,-1.868 ; 2.54,1.368 2.54,1.868 ; 2.54,2.368 2.54,1.868 ; 3.04,-1.868 2.54,-1.868 ; 3.04,1.868 2.54,1.868 ; -2.91,-3.43 -2.91,-0.305 -2.17,-0.305 -2.17,-3.43 -2.91,-3.43 ; -2.91,0.305 -2.17,0.305 -2.17,3.43 -2.91,3.43 -2.91,0.305 ; 2.17,-3.43 2.91,-3.43 2.91,-0.305 2.17,-0.305 2.17,-3.43 ; 2.17,0.305 2.91,0.305 2.91,3.43 2.17,3.43 2.17,0.305
Mechanical 14:
  drawing of 187 lines, arcs and shapes, not listed
Mechanical 15:
  lines w0.05: -3.425,-3.68 -3.425,3.68 3.425,3.68 3.425,-3.68 -3.425,-3.68
3D body "p313-075.stp": height 0.02, standoff 0, extent 2.165,-3.432 2.915,-0.302
3D body "p313-075.stp": height 0.02, standoff 0, extent 0.895,-3.432 1.645,-0.302
3D body "p313-075.stp": height 0.02, standoff 0, extent -0.375,-3.432 0.375,-0.302
3D body "p313-075.stp": height 0.02, standoff 0, extent -1.645,-3.432 -0.895,-0.302
3D body "p313-075.stp": height 0.02, standoff 0, extent -2.915,-3.432 -2.165,-0.302
3D body "p313-075.stp": height 0.02, standoff 0, extent 2.165,0.303 2.915,3.433
3D body "p313-075.stp": height 0.02, standoff 0, extent 0.895,0.303 1.645,3.433
3D body "p313-075.stp": height 0.02, standoff 0, extent -0.375,0.303 0.375,3.433
3D body "p313-075.stp": height 0.02, standoff 0, extent -1.645,0.303 -0.895,3.433
3D body "p313-075.stp": height 0.02, standoff 0, extent -2.915,0.303 -2.165,3.433
3D body "SAMTEC_FTS-105-02-F-DV.stp": height 3.17, standoff 0, extent -3.175,-2.921 3.175,2.921

## SAMTEC_FTS-125-02-F-DV [mm] "50 Contacts - Pitch 1.27mm - Dual Row, Vertical, Surface Mount Terminal Strip"
height 3.18
pads (50):
  rect 0.74x3.125 smd: 1(-15.24,-1.868) 2(-15.24,1.868) 3(-13.97,-1.868) 4(-13.97,1.868) 5(-12.7,-1.868) 6(-12.7,1.868) 7(-11.43,-1.868) 8(-11.43,1.868) 9(-10.16,-1.868) 10(-10.16,1.868) 11(-8.89,-1.868) 12(-8.89,1.868) 13(-7.62,-1.868) 14(-7.62,1.868) 15(-6.35,-1.868) 16(-6.35,1.868) 17(-5.08,-1.868) 18(-5.08,1.868) 19(-3.81,-1.868) 20(-3.81,1.868) 21(-2.54,-1.868) 22(-2.54,1.868) 23(-1.27,-1.868) 24(-1.27,1.868) 25(0,-1.868) 26(0,1.868) 27(1.27,-1.868) 28(1.27,1.868) 29(2.54,-1.868) 30(2.54,1.868) 31(3.81,-1.868) 32(3.81,1.868) 33(5.08,-1.868) 34(5.08,1.868) 35(6.35,-1.868) 36(6.35,1.868) 37(7.62,-1.868) 38(7.62,1.868) 39(8.89,-1.868) 40(8.89,1.868) 41(10.16,-1.868) 42(10.16,1.868) 43(11.43,-1.868) 44(11.43,1.868) 45(12.7,-1.868) 46(12.7,1.868) 47(13.97,-1.868) 48(13.97,1.868) 49(15.24,-1.868) 50(15.24,1.868)
Top Overlay:
  circle w0.25: c-15.238,-4.128 r0.125
  circle w0.25: c-15.238,-4.128 r0.125
  lines w0.2: -15.875,-1.714 -15.875,1.714 ; 15.875,-1.714 15.875,1.714
Mechanical 8:
  drawing of 220 lines, arcs and shapes, not listed
Mechanical 14:
  drawing of 947 lines, arcs and shapes, not listed
Mechanical 15:
  lines w0.05: -16.125,-3.68 -16.125,3.68 16.125,3.68 16.125,-3.68 -16.125,-3.68
3D body "p313-075.stp": height 0.02, standoff 0, extent 14.865,0.303 15.615,3.433
3D body "p313-075.stp": height 0.02, standoff 0, extent 14.865,-3.432 15.615,-0.302
3D body "p313-075.stp": height 0.02, standoff 0, extent 13.595,0.303 14.345,3.433
3D body "p313-075.stp": height 0.02, standoff 0, extent 13.595,-3.432 14.345,-0.302
3D body "p313-075.stp": height 0.02, standoff 0, extent 12.325,0.303 13.075,3.433
3D body "p313-075.stp": height 0.02, standoff 0, extent 12.325,-3.432 13.075,-0.302
3D body "p313-075.stp": height 0.02, standoff 0, extent 11.055,0.303 11.805,3.433
3D body "p313-075.stp": height 0.02, standoff 0, extent 11.055,-3.432 11.805,-0.302
3D body "p313-075.stp": height 0.02, standoff 0, extent 9.785,0.303 10.535,3.433
3D body "p313-075.stp": height 0.02, standoff 0, extent 9.785,-3.432 10.535,-0.302
3D body "p313-075.stp": height 0.02, standoff 0, extent 8.515,0.303 9.265,3.433
3D body "p313-075.stp": height 0.02, standoff 0, extent 8.515,-3.432 9.265,-0.302
3D body "p313-075.stp": height 0.02, standoff 0, extent 7.245,0.303 7.995,3.433
3D body "p313-075.stp": height 0.02, standoff 0, extent 7.245,-3.432 7.995,-0.302
3D body "p313-075.stp": height 0.02, standoff 0, extent 5.975,0.303 6.725,3.433
3D body "p313-075.stp": height 0.02, standoff 0, extent 5.975,-3.432 6.725,-0.302
3D body "p313-075.stp": height 0.02, standoff 0, extent 4.705,0.303 5.455,3.433
3D body "p313-075.stp": height 0.02, standoff 0, extent 4.705,-3.432 5.455,-0.302
3D body "p313-075.stp": height 0.02, standoff 0, extent 3.435,0.303 4.185,3.433
3D body "p313-075.stp": height 0.02, standoff 0, extent 3.435,-3.432 4.185,-0.302
3D body "p313-075.stp": height 0.02, standoff 0, extent 2.165,0.303 2.915,3.433
3D body "p313-075.stp": height 0.02, standoff 0, extent 2.165,-3.432 2.915,-0.302
3D body "p313-075.stp": height 0.02, standoff 0, extent 0.895,0.303 1.645,3.433
3D body "p313-075.stp": height 0.02, standoff 0, extent 0.895,-3.432 1.645,-0.302
3D body "p313-075.stp": height 0.02, standoff 0, extent -0.375,0.303 0.375,3.433
3D body "p313-075.stp": height 0.02, standoff 0, extent -0.375,-3.432 0.375,-0.302
3D body "p313-075.stp": height 0.02, standoff 0, extent -1.645,0.303 -0.895,3.433
3D body "p313-075.stp": height 0.02, standoff 0, extent -1.645,-3.432 -0.895,-0.302
3D body "p313-075.stp": height 0.02, standoff 0, extent -2.915,0.303 -2.165,3.433
3D body "p313-075.stp": height 0.02, standoff 0, extent -2.915,-3.432 -2.165,-0.302
3D body "p313-075.stp": height 0.02, standoff 0, extent -4.185,0.303 -3.435,3.433
3D body "p313-075.stp": height 0.02, standoff 0, extent -4.185,-3.432 -3.435,-0.302
3D body "p313-075.stp": height 0.02, standoff 0, extent -5.455,0.303 -4.705,3.433
3D body "p313-075.stp": height 0.02, standoff 0, extent -5.455,-3.432 -4.705,-0.302
3D body "p313-075.stp": height 0.02, standoff 0, extent -6.725,0.303 -5.975,3.433
3D body "p313-075.stp": height 0.02, standoff 0, extent -6.725,-3.432 -5.975,-0.302
3D body "p313-075.stp": height 0.02, standoff 0, extent -7.995,0.303 -7.245,3.433
3D body "p313-075.stp": height 0.02, standoff 0, extent -7.995,-3.432 -7.245,-0.302
3D body "p313-075.stp": height 0.02, standoff 0, extent -9.265,0.303 -8.515,3.433
3D body "p313-075.stp": height 0.02, standoff 0, extent -9.265,-3.432 -8.515,-0.302
3D body "p313-075.stp": height 0.02, standoff 0, extent -10.535,0.303 -9.785,3.433
3D body "p313-075.stp": height 0.02, standoff 0, extent -10.535,-3.432 -9.785,-0.302
3D body "p313-075.stp": height 0.02, standoff 0, extent -11.805,0.303 -11.055,3.433
3D body "p313-075.stp": height 0.02, standoff 0, extent -11.805,-3.432 -11.055,-0.302
3D body "p313-075.stp": height 0.02, standoff 0, extent -13.075,0.303 -12.325,3.433
3D body "p313-075.stp": height 0.02, standoff 0, extent -13.075,-3.432 -12.325,-0.302
3D body "p313-075.stp": height 0.02, standoff 0, extent -14.345,0.303 -13.595,3.433
3D body "p313-075.stp": height 0.02, standoff 0, extent -14.345,-3.432 -13.595,-0.302
3D body "p313-075.stp": height 0.02, standoff 0, extent -15.615,-3.432 -14.865,-0.302
3D body "p313-075.stp": height 0.02, standoff 0, extent -15.615,0.303 -14.865,3.433
3D body "SAMTEC_FTS-125-01-F-DV.stp": height 4.32, standoff 0, extent -15.875,-2.921 15.875,2.921